# Altium footprint library RPIadaptor.PcbLib: 85 footprints (part 3 of 6)
Each footprint in its own frame and in the unit in brackets; x right, y up, seen from the top. Pads: shape width x height; smd on the part's side, far side on the other; paste and mask are expansions set on the pad; w line width, h text height; cw(c..) or ccw(c..) is an arc to the next point about the centre after c.
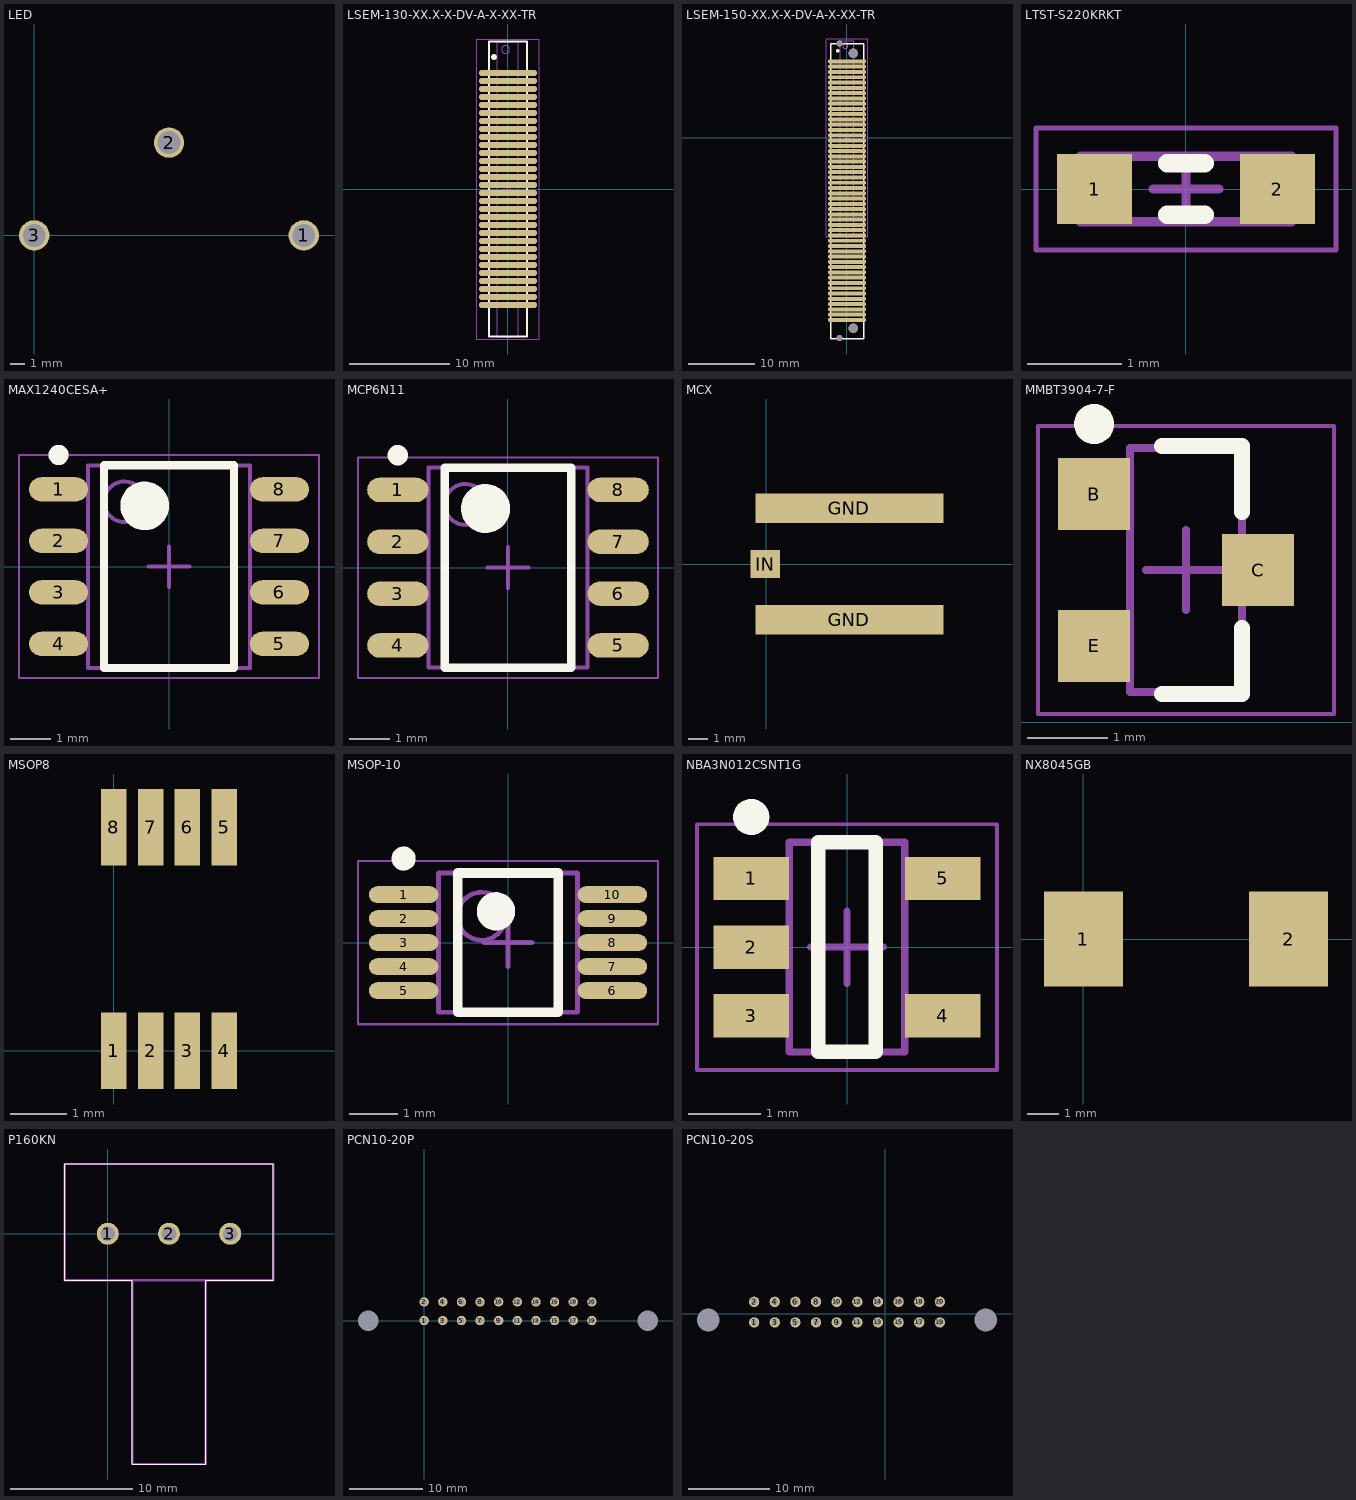
[diagram p2: the footprints below, top view; thin cyan lines are the x and y axes]

## LED [mil]
pads (3):
  round 80 hole 60: 1(710,0) 2(355,244.28) 3(0,0)

## LRS-75 [mm]
3D body "LRS-75 Mean Well.STEP": height 30, standoff 0, extent 0,0 97,99

## LSEM-130-XX.X-X-DV-A-X-XX-TR [mm]
height 8
pads (30):
  oval 5.8x0.6 smd: 1(0,11.6) 2(0,10.8) 3(0,10) 4(0,9.2) 5(0,8.4) 6(0,7.6) 7(0,6.8) 8(0,6) 9(0,5.2) 10(0,4.4) 11(0,3.6) 12(0,2.8) 13(0,2) 14(0,1.2) 15(0,0.4) 16(0,-0.4) 17(0,-1.2) 18(0,-2) 19(0,-2.8) 20(0,-3.6) 21(0,-4.4) 22(0,-5.2) 23(0,-6) 24(0,-6.8) 25(0,-7.6) 26(0,-8.4) 27(0,-9.2) 28(0,-10) 29(0,-10.8) 30(0,-11.6)
Top Overlay:
  circle w0.25: c-1.4,13.2 r0.152
  lines w0.2: -1.9,-14.75 -1.9,14.75 1.9,14.75 1.9,-14.75 -1.9,-14.75
Mechanical 13:
  circle w0.1: c-0.25,13.95 r0.4
  lines w0.1: -1.05,-14.75 -1.05,14.75 1.05,14.75 1.05,-14.75 -1.05,-14.75
Mechanical 15:
  lines w0.05: -3.15,-15 -3.15,15 3.15,15 3.15,-15 -3.15,-15
  lines w0.1: -0.5,0 0.5,0 ; 0,-0.5 0,0.5
3D body "LSEM-130-04.0-L-DV-A-N-TR.stp": height 5.5, standoff -0.8, extent -2.665,-14.2 2.465,14.3

## LSEM-150-XX.X-X-DV-A-X-XX-TR [mm]
height 8
pads (50):
  oval 5.8x0.6 smd: 1(0,11.6) 2(0,10.8) 3(0,10) 4(0,9.2) 5(0,8.4) 6(0,7.6) 7(0,6.8) 8(0,6) 9(0,5.2) 10(0,4.4) 11(0,3.6) 12(0,2.8) 13(0,2) 14(0,1.2) 15(0,0.4) 16(0,-0.4) 17(0,-1.2) 18(0,-2) 19(0,-2.8) 20(0,-3.6) 21(0,-4.4) 22(0,-5.2) 23(0,-6) 24(0,-6.8) 25(0,-7.6) 26(0,-8.4) 27(0,-9.2) 28(0,-10) 29(0,-10.8) 30(0,-11.6) 31(0,-12.4) 32(0,-13.2) 33(0,-14) 34(0,-14.8) 35(0,-15.6) 36(0,-16.4) 37(0,-17.2) 38(0,-18) 39(0,-18.8) 40(0,-19.6) 41(0,-20.4) 42(0,-21.2) 43(0,-22) 44(0,-22.8) 45(0,-23.6) 46(0,-24.4) 47(0,-25.2) 48(0,-26) 49(0,-26.8) 50(0,-27.6)
via -1.15,-30.325 diameter 0.9 hole 0.9
via -1.15,14.325 diameter 0.9 hole 0.9
via 0.95,-28.85 diameter 1.42 hole 1.42
via 0.95,12.85 diameter 1.42 hole 1.42
Top Overlay:
  circle w0.25: c-1.4,13.2 r0.152
  lines w0.2: -2.489,-30.429 -2.489,14.3 2.515,14.3 2.515,-30.429 -2.489,-30.429
Mechanical 13:
  circle w0.1: c-0.25,13.95 r0.4
  lines w0.1: -1.05,-14.75 -1.05,14.75 1.05,14.75 1.05,-14.75 -1.05,-14.75
Mechanical 15:
  lines w0.05: -3.15,-15 -3.15,15 3.15,15 3.15,-15 -3.15,-15
  lines w0.1: -0.5,0 0.5,0 ; 0,-0.5 0,0.5
3D body "LSEM-150-04.0-L-DV-A-N-TR.stp": height 5.6, standoff -0.7, extent -2.591,-30.301 2.539,14.199

## LTST-S220KRKT [mm]
height 1.1
pads (2):
  rect 0.8x0.75 smd: 1(-0.975,0) 2(0.975,0)
Top Overlay:
  lines w0.2: -0.2,-0.275 0.2,-0.275 ; -0.2,0.275 0.2,0.275
Mechanical 13:
  lines w0.1: -1.125,-0.35 1.125,-0.35 1.125,0.35 -1.125,0.35 -1.125,-0.35
Mechanical 15:
  lines w0.05: -1.6,-0.65 1.6,-0.65 1.6,0.65 -1.6,0.65 -1.6,-0.65
  lines w0.1: -0.35,0 0.35,0 ; 0,-0.35 0,0.35
3D body "LTST-S220KRKT.step": height 1.1, standoff 0, extent -1.125,-0.35 1.125,0.35

## MAX1240CESA+ [mm]
height 1.75
pads (8):
  oval 1.45x0.6 smd: 1(-2.725,1.905) 2(-2.725,0.635) 3(-2.725,-0.635) 4(-2.725,-1.905) 5(2.725,-1.905) 6(2.725,-0.635) 7(2.725,0.635) 8(2.725,1.905)
Top Overlay:
  circle w0.6: c-0.6,1.5 r0.3
  circle w0.25: c-2.725,2.755 r0.125
  lines w0.2: -1.6,-2.5 1.6,-2.5 1.6,2.5 -1.6,2.5 -1.6,-2.5
Mechanical 13:
  circle w0.1: c-1.1,1.6 r0.5
  lines w0.1: -2,-2.5 2,-2.5 2,2.5 -2,2.5 -2,-2.5
Mechanical 15:
  lines w0.05: -3.7,-2.75 3.7,-2.75 3.7,2.75 -3.7,2.75 -3.7,-2.75
  lines w0.1: -0.5,0 0.5,0 ; 0,-0.5 0,0.5
3D body "MAX1240CESA+.step": height 1.75, standoff 0, extent -3,-2.5 3,2.5

## MCP6N11 [mm] "SOIC, 8-Leads, Body 4.90x3.90mm, Pitch 1.27mm, IPC Medium Density"
height 1.75
pads (8):
  oval 1.5x0.6 smd: 1(-2.7,1.905) 2(-2.7,0.635) 3(-2.7,-0.635) 4(-2.7,-1.905) 5(2.7,-1.905) 6(2.7,-0.635) 7(2.7,0.635) 8(2.7,1.905)
Top Overlay:
  circle w0.25: c-2.7,2.755 r0.125
  circle w0.6: c-0.55,1.45 r0.3
  lines w0.2: -1.55,-2.45 -1.55,2.45 1.55,2.45 1.55,-2.45 -1.55,-2.45
Mechanical 13:
  circle w0.1: c-1.05,1.55 r0.5
  lines w0.1: -1.95,-2.45 -1.95,2.45 1.95,2.45 1.95,-2.45 -1.95,-2.45
Mechanical 15:
  lines w0.05: -3.675,-2.7 -3.675,2.7 3.675,2.7 3.675,-2.7 -3.675,-2.7
  lines w0.1: -0.5,0 0.5,0 ; 0,-0.5 0,0.5
3D body "MCP6N11.step": height 1.75, standoff 0, extent -3,-2.45 3,2.45

## MCX [mm] "CONN MCX RCPT STR 50OHM EDGE MNT"
pads (3):
  rect 9.6x1.5 smd: GND(4.25,-2.85) GND(4.25,2.85)
  rect 1.5x1.45 smd: IN(-0.05,0)
3D body "734151061.stp": height 3, standoff -2, extent -0.55,-3.346 8.746,3.346

## MMBT3904-7-F [mm] "SOT23-3"
height 1.1
pads (3):
  rect 0.9x0.9 smd: B(-3.45,2.85) C(-1.4,1.9) E(-3.45,0.95)
Top Overlay:
  circle w0.25: c-3.45,3.725 r0.125
  lines w0.2: -2.6,0.35 -1.6,0.35 -1.6,1.175 ; -2.6,3.45 -1.6,3.45 -1.6,2.625
Mechanical 13:
  lines w0.1: -3,0.375 -1.6,0.375 -1.6,3.425 -3,3.425 -3,0.375
Mechanical 15:
  lines w0.05: -4.15,0.1 -0.45,0.1 -0.45,3.7 -4.15,3.7 -4.15,0.1
  lines w0.1: -2.8,1.9 -1.8,1.9 ; -2.3,1.4 -2.3,2.4
3D body "MMBT3904-7-F.step": height 1.1, standoff 0, extent -3.65,0.375 -1.15,3.425

## MSOP8 [mm]
pads (8):
  rect 0.45x1.35 smd: 1(0,0) 2(0.65,0) 3(1.3,0) 4(1.95,0) 5(1.95,3.95) 6(1.3,3.95) 7(0.65,3.95) 8(0,3.95)
3D body "User Library-MSOP8-3.STEP": height 0.93, standoff -0.06, extent -0.509,-0.424 2.491,4.435

## MSOP-10 [mm]
height 1.1
pads (10):
  oval 1.45x0.35 smd: 1(-2.175,1) 2(-2.175,0.5) 3(-2.175,0) 4(-2.175,-0.5) 5(-2.175,-1) 6(2.175,-1) 7(2.175,-0.5) 8(2.175,0) 9(2.175,0.5) 10(2.175,1)
Top Overlay:
  circle w0.4: c-0.25,0.65 r0.2
  circle w0.25: c-2.175,1.75 r0.125
  lines w0.2: -1.05,-1.45 1.05,-1.45 1.05,1.45 -1.05,1.45 -1.05,-1.45
Mechanical 13:
  circle w0.1: c-0.55,0.55 r0.5
  lines w0.1: -1.45,-1.45 1.45,-1.45 1.45,1.45 -1.45,1.45 -1.45,-1.45
Mechanical 15:
  lines w0.05: -3.125,-1.7 3.125,-1.7 3.125,1.7 -3.125,1.7 -3.125,-1.7
  lines w0.1: -0.5,0 0.5,0 ; 0,-0.5 0,0.5
3D body "MSOP-10.step": height 1.1, standoff 0, extent -2.45,-1.45 2.45,1.45

## NBA3N012CSNT1G [mm] "SOT23, 5-Leads, Body 2.90x2.80mm, Pitch 0.95mm, IPC Medium Density"
height 1.45
pads (5):
  rect 1.05x0.6 smd: 1(-1.325,0.95) 2(-1.325,0) 3(-1.325,-0.95) 4(1.325,-0.95) 5(1.325,0.95)
Top Overlay:
  circle w0.25: c-1.325,1.8 r0.125
  lines w0.2: -0.4,-1.45 -0.4,1.45 0.4,1.45 0.4,-1.45 -0.4,-1.45
Mechanical 13:
  lines w0.1: -0.8,-1.45 0.8,-1.45 0.8,1.45 -0.8,1.45 -0.8,-1.45
Mechanical 15:
  lines w0.05: -2.075,-1.7 2.075,-1.7 2.075,1.7 -2.075,1.7 -2.075,-1.7
  lines w0.1: -0.5,0 0.5,0 ; 0,-0.5 0,0.5
3D body "NBA3N012CSNT1G.step": height 1.45, standoff 0, extent -1.4,-1.45 1.4,1.45

## NX8045GB [mm]
pads (2):
  rect 2.5x3 smd: 1(0,0) 2(6.5,0)
3D body "User Library-cry_8045.step": height 1.8, standoff 0, extent -0.78,-2.2 7.22,2.3

## P160KN [mm]
pads (3):
  round 1.8 hole 1.2: 1(0,0) 2(5,0) 3(10,0)
Top Overlay:
  lines w0.1: -3.5,-3.8 2,-3.8 2,-18.8 8,-18.8 8,-3.8 13.5,-3.8 13.5,5.7 -3.5,5.7 -3.5,-3.8
Mechanical 13:
  lines w0.2: -3.5,-3.8 13.5,-3.8 13.5,5.7 -3.5,5.7 -3.5,-3.8 ; 2,-18.8 8,-18.8 8,-3.8 2,-3.8 2,-18.8

## PCN10-20P [mil]
pads (22):
  round 50 hole 31.5: 1(0,0) 2(0,100) 3(100,0) 4(100,100) 5(200,0) 6(200,100) 7(300,0) 8(300,100) 9(400,0) 10(400,100) 11(500,0) 12(500,100) 13(600,0) 14(600,100) 15(700,0) 16(700,100) 17(800,0) 18(800,100) 19(900,0) 20(900,100)
  round 60 hole 110: ""(-300,0) ""(1200,0)
3D body "PCN10-20P-2.54DSA.stp": height 456.69, standoff -125.98, extent -405,-119.29 1299.72,219.29

## PCN10-20S [mil]
pads (22):
  round 50 hole 31.5: 1(-635,-42) 2(-635,58) 3(-535,-42) 4(-535,58) 5(-435,-42) 6(-435,58) 7(-335,-42) 8(-335,58) 9(-235,-42) 10(-235,58) 11(-135,-42) 12(-135,58) 13(-35,-42) 14(-35,58) 15(65,-42) 16(65,58) 17(165,-42) 18(165,58) 19(265,-42) 20(265,58)
  round 60 hole 110: ""(-856.65,-30.19) ""(486.65,-30.19)
3D body "PCN10C-20S-2.54DSA.stp": height 452.76, standoff -153.54, extent -956,-149.45 584.16,169.45